# Altium integrated library Mastermind Devices.IntLib: 910 symbols (part 5 of 6)
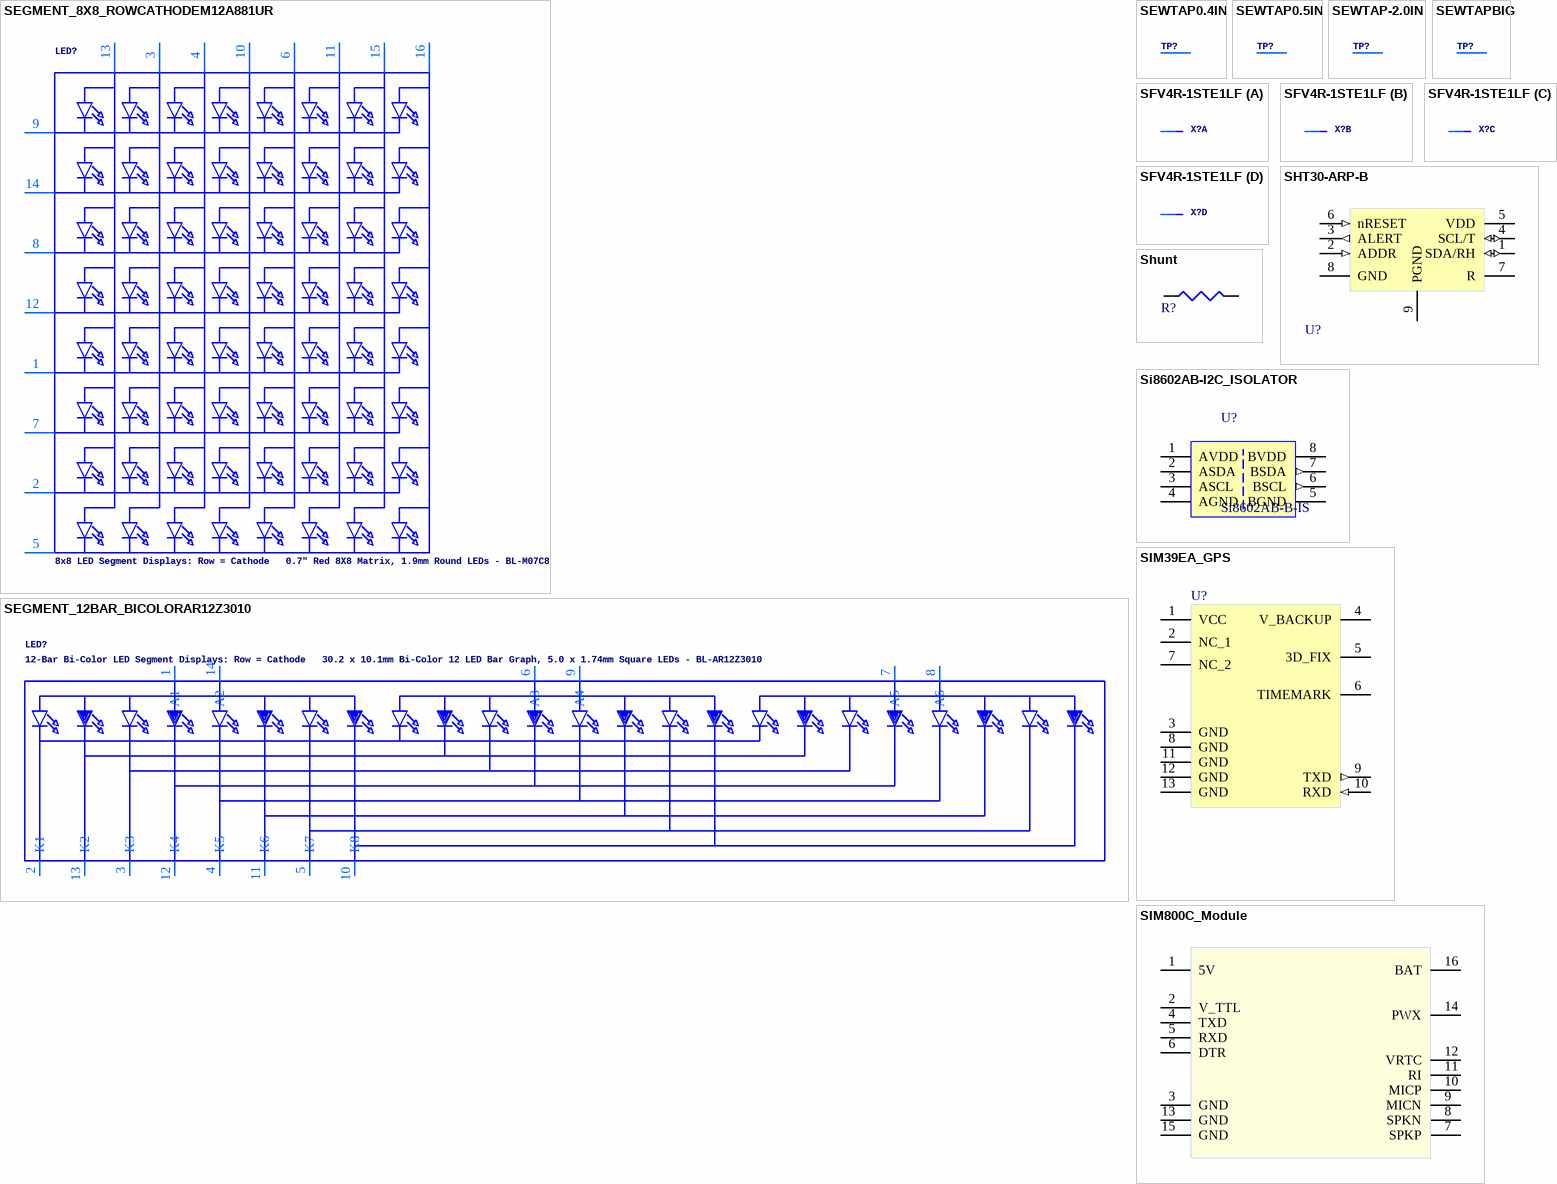
[diagram p43: symbols SEGMENT_8X8_ROWCATHODEM12A881UR to SIM800C_Module]

## SEGMENT_8X8_ROWCATHODEM12A881UR
designator LED?, comment 8x8 LED Segment Displays: Row = Cathode   0.7" Red 8X8 Matrix, 1.9mm Round LEDs - BL-M07C881UR   1.2" Red 8x8 Matrix, 3.0mm Round LEDs - BL-M12A881UR   1.2" Red 8x8 Matrix, 3.0mm Square LEDs - BL-M12A883
footprint SEGMENT_BL-M12A881UR
pins: 1 K5, 2 K7, 3 A2, 4 A3, 5 K8, 6 A5, 7 K6, 8 K3, 9 K1, 10 A4, 11 A6, 12 K4, 13 A1, 14 K2, 15 A7, 16 A8

## SEGMENT_12BAR_BICOLORAR12Z3010
designator LED?, comment 12-Bar Bi-Color LED Segment Displays: Row = Cathode   30.2 x 10.1mm Bi-Color 12 LED Bar Graph, 5.0 x 1.74mm Square LEDs - BL-AR12Z3010
footprint SEGMENT_BICOL_BL-AR12Z3010
pins: 1 A1, 2 K1, 3 K3, 4 K5, 5 K7, 6 A3, 7 A5, 8 A6, 9 A4, 10 K8, 11 K6, 12 K4, 13 K2, 14 A2

## SEWTAP0.4IN
designator TP?
footprint SEWINGTAP_0.4
pins: TAP SEW

## SEWTAP0.5IN
designator TP?
footprint SEWINGTAP_0.5
pins: TAP SEW

## SEWTAP-2.0IN
designator TP?
footprint SEWINGTAP_2.0
pins: P$1 SEW

## SEWTAPBIG
designator TP?
footprint BIGTAP
pins: P$1 SEW

## SFV4R-1STE1LF
designator X?, comment FPC Connector ZIF for SMT 0.5mm   SFV4R-1STE1LF Useful as the LED backlight connector for a PSP display  (value not drawn)
footprint SFV4R-1STE1LF
part A pins: 1 S
part B pins: 2 S
part C pins: 3 S
part D pins: 4 S

## SHT30-ARP-B
designator U?, comment HUMIDITY, TEMPERATURE  (value not drawn)
HUMIDITY, TEMPERATURE ANALOG VOLTAGE 0 ~ 100% RH ±3% RH DFN_8 TEMPERATURE & HUMIDITY SENSORS ROHS
footprint DFN-8_L2.5-W2.5-P0.50-BL-EP3 (HUMIDITY, TEMPERATURE ANALOG VOLTAGE 0 ~ 100% RH ±3% RH DFN_8 TEMPERATURE & HUMIDITY SENSORS ROHS)
pins: 1 SDA/RH (io), 2 ADDR (in), 3 ALERT (out), 4 SCL/T (io), 5 VDD, 6 nRESET (in), 7 R, 8 GND, 9 PGND

## Shunt
designator R?, comment load  (value not drawn)
Shunt Res
footprint Shunt R001
footprint R1812
footprint R2010
footprint R2012
footprint R2512
footprint R2512 - duplicate
pins: 1, 2

## Si8602AB-I2C_ISOLATOR
designator U?, comment Si8602AB-B-IS
I2C i; DETAILS: I²C Digital Isolator 2500Vrms 2 Channel 25kV/µs (Typ) CMTI 8-SOIC (0.154", 3.90mm Width); MFG: Skyworks Solutions Inc.; MFGPN: SI8401AB-B-IS; VALUE: I²C Digital Isolator 2500Vrms 2 Channel 25kV/µs; PACKAGE: 8SOIC; URL: https://www.digikey.com/en/products/detail/skyworks-solutions-inc/SI8401AB-B-IS/2278173
footprint SOIC-8E (SOIC, 8-Leads, Body 4.90x3.90mm, Pitch 1.27mm, IPC Medium Density)
footprint SOIC-8_L4.9-W3.9-P1.27-LS6.0-BL
pins: 1 AVDD (power), 2 ASDA, 3 ASCL, 4 AGND (power), 5 BGND (power), 6 BSCL (out), 7 BSDA (out), 8 BVDD (power)

## SIM39EA_GPS
designator U?
PackageDocument: ver1.0, May-2003; AEMS Code: CHANGED VALUE; DatasheetDocument: ver2.3, May-2004; PackageReference: VO20; Code_JEDEC: MO-153-AC
footprint SIM39Ea (Lora module)
pins: 1 VCC (power) "+3.3V or 2.5V JTAG Signals I/O Supply.", 2 NC_1 (power) "+3.3V Supply for internal logic.", 3 GND (power) "Ground", 4 V_BACKUP "Leave Unconnected.", 5 3D_FIX "Leave Unconnected.", 6 TIMEMARK "Leave Unconnected.", 7 NC_2 (power) "+3.3V, 2.5V, or 1.8V I/O Supply.", 8 GND (power) "Ground", 9 TXD (out) "Leave Unconnected.", 10 RXD (in) "Leave Unconnected.", 11 GND (power) "Ground", 12 GND (power) "Ground", 13 GND (power) "Ground"

## SIM800C_Module
designator X?
footprint SIM800C_Module
pins: 1 5V, 2 V_TTL, 3 GND, 4 TXD, 5 RXD, 6 DTR, 7 SPKP, 8 SPKN, 9 MICN, 10 MICP, 11 RI, 12 VRTC, 13 GND, 14 PWX, 15 GND, 16 BAT

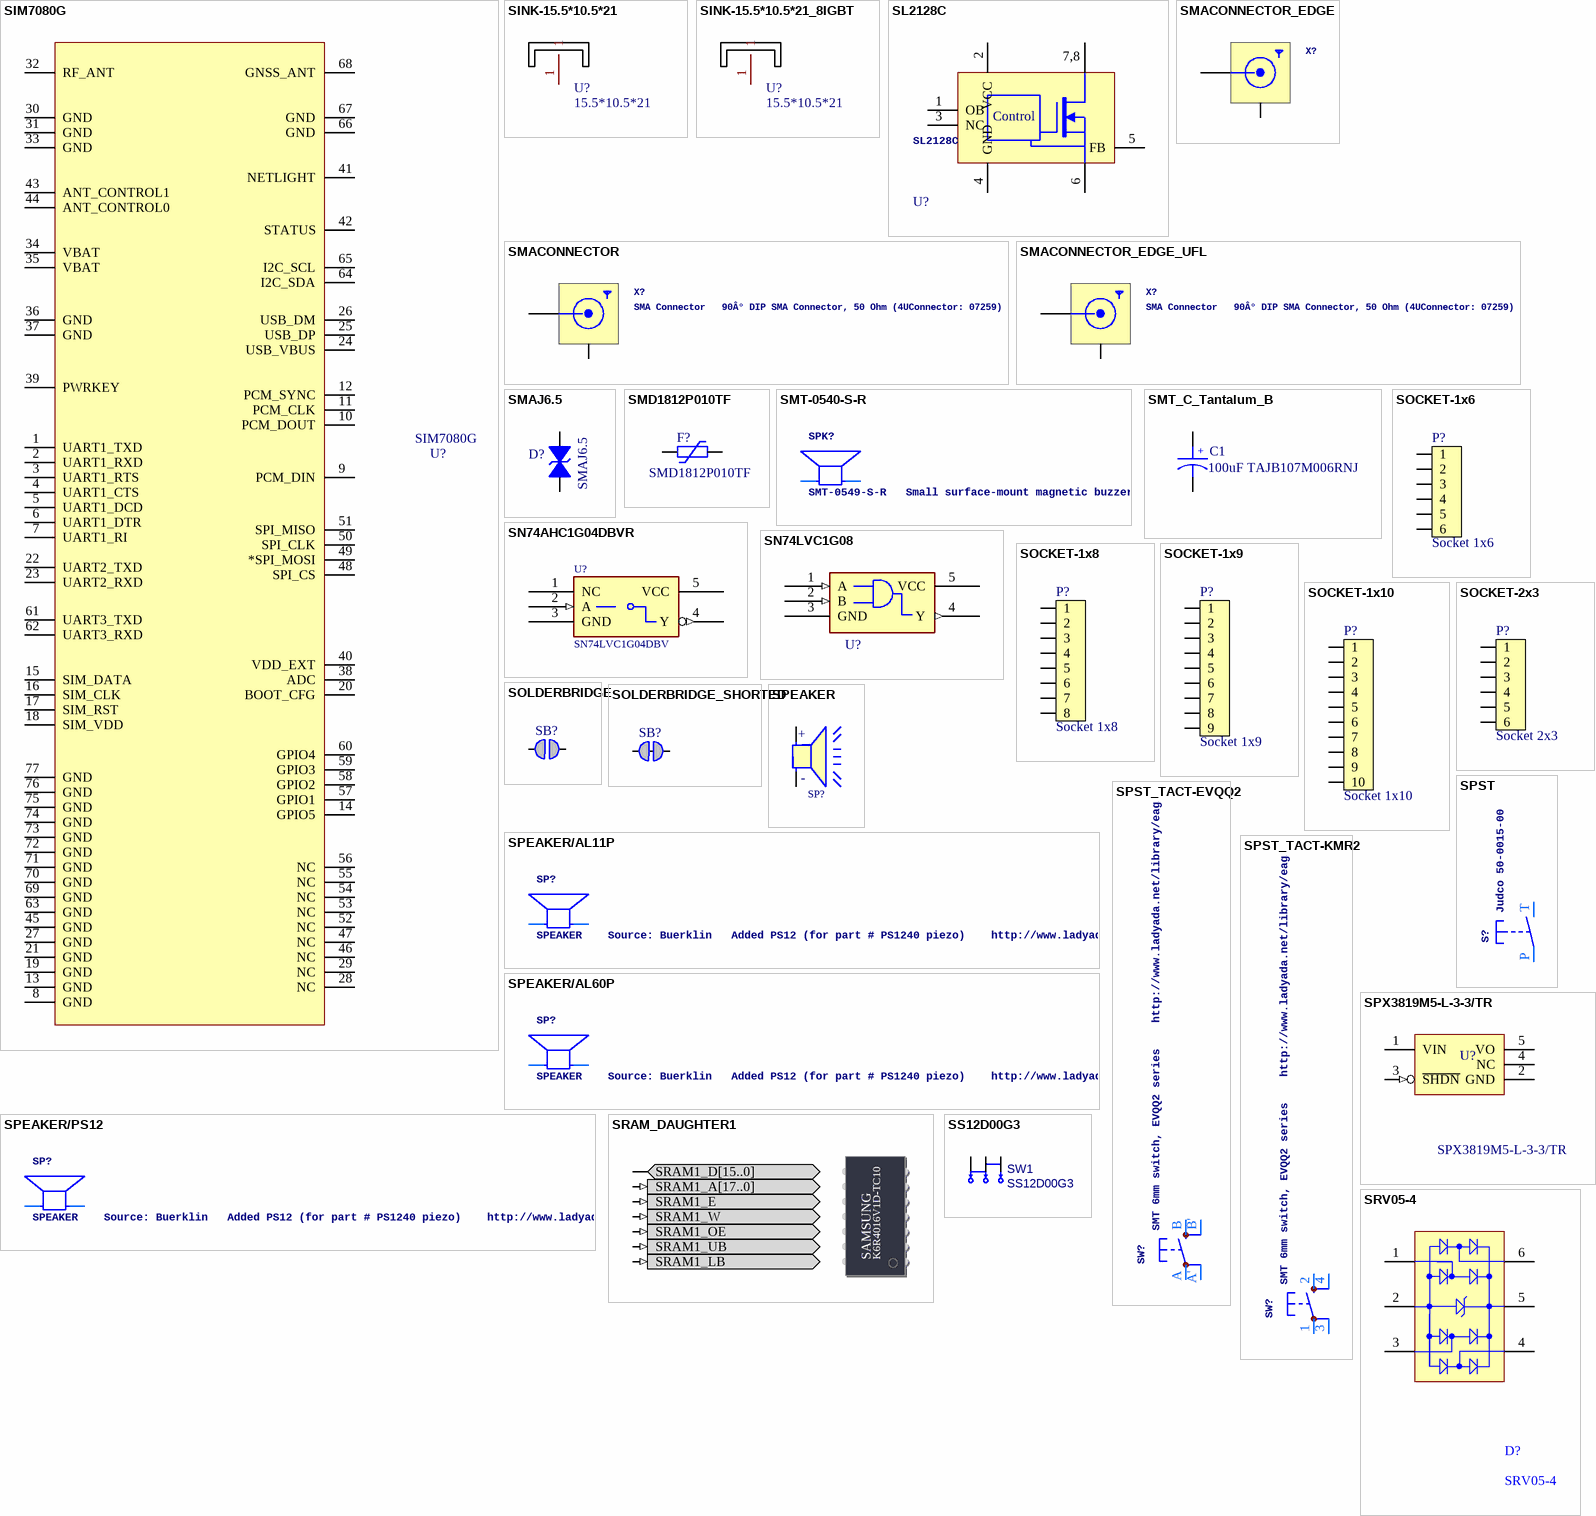
[diagram p30: symbols SIM7080G to SS12D00G3]

## SIM7080G
designator U?
SMD,17.6x15.7mm RF Transceiver Modules and Modems RoHS; Manufacturer: SIMCOM(芯讯通无线科技); Add into BOM: yes; Symbol: SIM7080G; Device: SIM7080G; LCSC Part Name: 多频段CAT-M和NB-IoT模块; Supplier Part: C2943992; Manufacturer Part: SIM7080G; Supplier Footprint: SMD,15.7x17.6mm; JLCPCB Part Class: Extended Part; Datasheet: https://item.szlcsc.com/datasheet/SIM7080G/3329189.html; Supplier: LCSC; Convert to PCB: yes
footprint LCC-SMD_SIM7080G
3D model LCC-SMD_SIM7080G
pins: 1 UART1_TXD, 2 UART1_RXD, 3 UART1_RTS, 4 UART1_CTS, 5 UART1_DCD, 6 UART1_DTR, 7 UART1_RI, 8 GND, 9 PCM_DIN, 10 PCM_DOUT, 11 PCM_CLK, 12 PCM_SYNC, 13 GND, 14 GPIO5, 15 SIM_DATA, 16 SIM_CLK, 17 SIM_RST, 18 SIM_VDD, 19 GND, 20 BOOT_CFG, 21 GND, 22 UART2_TXD, 23 UART2_RXD, 24 USB_VBUS, 25 USB_DP, 26 USB_DM, 27 GND, 28 NC, 29 NC, 30 GND, 31 GND, 32 RF_ANT, 33 GND, 34 VBAT, 35 VBAT, 36 GND, 37 GND, 38 ADC, 39 PWRKEY, 40 VDD_EXT, 41 NETLIGHT, 42 STATUS, 43 ANT_CONTROL1, 44 ANT_CONTROL0, 45 GND, 46 NC, 47 NC, 48 SPI_CS, 49 *SPI_MOSI, 50 SPI_CLK, 51 SPI_MISO, 52 NC, 53 NC, 54 NC, 55 NC, 56 NC, 57 GPIO1, 58 GPIO2, 59 GPIO3, 60 GPIO4, 61 UART3_TXD, 62 UART3_RXD, 63 GND, 64 I2C_SDA, 65 I2C_SCL, 66 GND, 67 GND, 68 GNSS_ANT, 69 GND, 70 GND, 71 GND, 72 GND, 73 GND, 74 GND, 75 GND, 76 GND, 77 GND

## SINK-15.5*10.5*21
designator U?, comment 15.5*10.5*21
Manufacturer: XSD(鑫顺达); Symbol: 15*10.5*21; Add into BOM: yes; ProductSize: 15.5*10.5*21MM; TextureOfMaterial: 6063-T5; SurfaceTreatment: 本色洗白; Shape: HType; SpringBuckle: -；-；-；-；-；-；-；-; Device: 15.5*10.5*21; LCSC Part Name: H型散热片; Supplier Part: C4649; Manufacturer Part: 15.5*10.5*21; Supplier Footprint: -; JLCPCB Part Class: Extended Part; Datasheet: https://atta.szlcsc.com/upload/public/pdf/source/20171202/C4649_15122106328221160233.pdf; Supplier: LCSC; Convert to PCB: yes; brand: XSD(鑫顺达); Model: 15.5*10.5*21; Colour: White; NumberOfHoles: -; NumberOfTeeth: -; NumberOfNails: -
footprint SINK-TH_L15.0-W10.5-H21.0
pins: 1

## SINK-15.5*10.5*21_8IGBT
designator U?, comment 15.5*10.5*21
Manufacturer: XSD(鑫顺达); Symbol: 15*10.5*21; Add into BOM: yes; ProductSize: 15.5*10.5*21MM; TextureOfMaterial: 6063-T5; SurfaceTreatment: 本色洗白; Shape: HType; SpringBuckle: -；-；-；-；-；-；-；-; Device: 15.5*10.5*21; LCSC Part Name: H型散热片; Supplier Part: C4649; Manufacturer Part: 15.5*10.5*21; Supplier Footprint: -; JLCPCB Part Class: Extended Part; Datasheet: https://atta.szlcsc.com/upload/public/pdf/source/20171202/C4649_15122106328221160233.pdf; Supplier: LCSC; Convert to PCB: yes; brand: XSD(鑫顺达); Model: 15.5*10.5*21; Colour: White; NumberOfHoles: -; NumberOfTeeth: -; NumberOfNails: -
footprint SINK-TH_L15.0-W10.5-H21.0 - 8IGBT
pins: 1

## SL2128C
designator U?
SMPS DRIVER
footprint DIL08-ROUND
pins: 1 OB (power), 2 VCC, 3 NC, 4 GND, 5 FB (power), 6 GND, 7 OC, 8 OC
text: 7,8; Control

## SMACONNECTOR
designator X?, comment SMA Connector   90Â° DIP SMA Connector, 50 Ohm (4UConnector: 07259)
footprint SMA90_DIP
pins: F ANT, GND (power)

## SMACONNECTOR_EDGE
designator X?, comment SMA Connector   90Â° DIP SMA Connector, 50 Ohm (4UConnector: 07259)  (value not drawn)
footprint SMA_EDGELAUNCH
pins: F ANT, GND (power)

## SMACONNECTOR_EDGE_UFL
designator X?, comment SMA Connector   90Â° DIP SMA Connector, 50 Ohm (4UConnector: 07259)
footprint SMA_EDGELAUNCH_UFL
pins: F ANT, GND GND3 (power)

## SMAJ6.5
designator D?
6.5V DO-214AC(SMA) ESD and Surge Protection (TVS/ESD) ROHS; Manufacturer: Brightking(台湾君耀); Manufacturer Part: SMAJ6.5CA/TR7; Contributor: lcsc; Supplier: LCSC; Supplier Part: C3036084; spicePre: D; spiceSymbolName: SMAJ6.5CA/TR7
footprint SMA_L4.3-W2.6-LS5.1-BI
pins: 1, 2

## SMD1812P010TF
designator F?
30V 100mA 100A 300mA 1812 Resettable Fuses ROHS; Contributor: Warren375; spicePre: F
footprint PTC1812L
pins: 1, 2

## SMT-0540-S-R
designator SPK?, comment SMT-0549-S-R   Small surface-mount magnetic buzzer
footprint SMT-0540-S-R
pins: + -, - +

## SMT_C_Tantalum_B
designator C1, comment 100uF TAJB107M006RNJ
Capacitor, SM Tantalum; Body 3.5 x 2.8 mm (LxW typ)
footprint SMT_C_Tantalum_B (Capacitor, SM Tantalum; Body 3.5 x 2.8 mm (LxW typ))
pins: 1, 2
text: +

## SN74AHC1G04DBVR
designator U?, comment SN74LVC1G04DBV
Manufacturer: TI
footprint SO-G5/P.95
pins: 1 NC, 2 A (in), 3 GND (power), 4 Y (out), 5 VCC (power)

## SN74LVC1G08
designator U?  (value not drawn)
AND GATE  IC SOT23-5
footprint SOT23-5L
pins: 1 A (in), 2 B (in), 3 GND (power), 4 Y (out), 5 VCC (power)

## SOCKET-1x6
designator P?, comment Socket 1x6
Socket 1x6, 2.54mm (100mil), SMD; Part Number: Socket 1x6 SMD; Manufacturer: WCON; Manufacturer Part Number: 2171-106MS0CUNR1; 2nd source part number: SSM-106-F-SV-P-TR; Artikkelnr Noca: 55030001; Artikkelnr Simpro: N.A.; Datasheet: *; Footprint Doc: SOCKET_1x6_SMD; LatestRevisionDate: 2016-01-22; Pin Count: 6; Publisher: Nordic Semiconductor; Published: 2016-01-22; Value: Socket 1x6; Note: *; Supplier: Cabcon; Supplier part number: 2171-106MS0CUNR1; 2nd source Supplier: Samtec
footprint SOCKET_1x6_SMD
pins: 1, 2, 3, 4, 5, 6

## SOCKET-1x8
designator P?, comment Socket 1x8
Socket 1x8, 2.54mm (100mil), SMD; Part Number: Socket 1x8 SMD; Manufacturer: WCON; Manufacturer Part Number: 2171-108MS0CUNR1; 2nd source part number: SSM-108-F-SV-P-TR; Artikkelnr Noca: 55030002; Artikkelnr Simpro: N.A.; Datasheet: *; Footprint Doc: SOCKET_1x8_SMD; LatestRevisionDate: 2016-01-22; Pin Count: 8; Publisher: Nordic Semiconductor; Published: 2016-01-22; Value: Socket 1x8; Note: *; Supplier: Cabcon; Supplier part number: 2171-108MS0CUNR1; 2nd source Supplier: Samtec
footprint SOCKET_1x8_SMD
pins: 1, 2, 3, 4, 5, 6, 7, 8

## SOCKET-1x9
designator P?, comment Socket 1x9
Socket 1x9, 2.54mm (100mil), SMD; Part Number: Socket 1x9 SMD; Manufacturer: WCON; Manufacturer Part Number: 2171-109MS0CUNR1; 2nd source part number: SSM-109-L-SV; Artikkelnr Noca: 55030003; Artikkelnr Simpro: N.A.; Datasheet: *; Footprint Doc: SOCKET_1x9_SMD; LatestRevisionDate: 2016-01-22; Pin Count: 9; Publisher: Nordic Semiconductor; Published: 2016-01-22; Value: Socket 1x9; Note: *; Supplier: Cabcon; Supplier part number: 2171-109MS0CUNR1; 2nd source Supplier: Samtec
footprint SOCKET_1x9_SMD
pins: 1, 2, 3 (power), 4 (power), 5 (power), 6 (power), 7 (power), 8 (power), 9 (power)

## SOCKET-1x10
designator P?, comment Socket 1x10
Socket 1x10, 2.54mm (100mil), SMD; Part Number: Socket 1x10 SMD; Manufacturer: WCON; Manufacturer Part Number: 2171-110MS0CUNR1; 2nd source part number: SSM-110-F-SV-P-TR; Artikkelnr Noca: 55030004; Artikkelnr Simpro: N.A.; Datasheet: *; Footprint Doc: SOCKET_1x10_SMD; LatestRevisionDate: 2016-01-22; Pin Count: 10; Publisher: Nordic Semiconductor; Published: 2016-01-22; Value: Socket 1x10; Note: *; Supplier: Cabcon; Supplier part number: 2171-110MS0CUNR1; 2nd source Supplier: Samtec
footprint SOCKET_1x10_SMD
pins: 1, 2, 3, 4, 5, 6, 7, 8, 9, 10

## SOCKET-2x3
designator P?, comment Socket 2x3
Socket 2x3, 2.54mm (100mil), SMD; Part Number: Socket 2x3 SMD Bottom; Manufacturer: Samtec; Manufacturer Part Number: SSM-103-F-DV-P-TR; 2nd source part number: S5712-ND; Note: Not mounted; Artikkelnr Noca: 55019255; Artikkelnr Simpro: N.A.; Datasheet: http://www.samtec.com/documents/webfiles/pdf/SSM_SM.PDF; LatestRevisionDate: 2014-06-10; Pin Count: 6; Publisher: Nordic Semiconductor; Published: 2014-06-10; Value: Socket 2x3; Supplier: Samtec; Supplier part number: SSM-103-F-DV-P-TR; 2nd source Supplier: Digi-Key; Footprint Doc: SOCKET_2x3_SMD-2.54mm-bottom
footprint SOCKET_2x3_SMD-2.54mm-bottom
pins: 1, 2, 3 (power), 4 (power), 5 (power), 6 (power)

## SOLDERBRIDGE
designator SB?, comment Solderbridge  (value not drawn)  (no BOM)
Artikkelnr Noca: N.A.; Part Number: Solderbridge; Manufacturer: *; Manufacturer Part Number: *; Datasheet: *; LatestRevisionDate: 2009-12-14; Pin Count: 2; Publisher: Nordic Semiconductor; Published: 2009-12-14; Value: Solderbridge; Note: *; Supplier: *; Supplier part number: *; 2nd source Supplier: *; 2nd source part number: *; Footprint Doc: Solderbridge; Artikkelnr Simpro: N.A.
footprint Solderbridge
pins: 1 0, 2 1

## SOLDERBRIDGE_SHORTED
designator SB?, comment Solderbridge  (value not drawn)  (net tie, no BOM)
Shorted Solderbridge; Part Number: Solderbridge Shorted; Artikkelnr Noca: N.A.; Manufacturer: *; Manufacturer Part Number: *; Datasheet: *; LatestRevisionDate: 2012-08-07; Pin Count: 2; Publisher: Nordic Semiconductor; Published: 2012-08-07; Value: Solderbridge; Note: *; Supplier: *; Supplier part number: *; 2nd source Supplier: *; 2nd source part number: *; Footprint Doc: Solderbridge_Shorted; Artikkelnr Simpro: N.A.
footprint Solderbridge_Shorted
pins: 1 0, 2 1

## SPEAKER
designator SP?, comment BUZZER    Source: Buerklin  (value not drawn)
OC_FARNELL: unknown; OC_NEWARK: unknown
footprint HDR1X2
pins: 1 -, 2 +

## SPEAKER/AL11P
designator SP?, comment SPEAKER    Source: Buerklin   Added PS12 (for part # PS1240 piezo)    http://www.ladyada.net/library/pcb/eaglelibrary.html
footprint AL11P
pins: +, -

## SPEAKER/AL60P
designator SP?, comment SPEAKER    Source: Buerklin   Added PS12 (for part # PS1240 piezo)    http://www.ladyada.net/library/pcb/eaglelibrary.html
footprint AL60P
pins: 1 +, 2 -

## SPEAKER/PS12
designator SP?, comment SPEAKER    Source: Buerklin   Added PS12 (for part # PS1240 piezo)    http://www.ladyada.net/library/pcb/eaglelibrary.html
footprint PS12
pins: P$1 +, P$2 -

## SPST
designator S?, comment Judco 50-0015-00
footprint JUDCOSPST
pins: P, T S

## SPST_TACT-EVQQ2
designator SW?, comment SMT 6mm switch, EVQQ2 series    http://www.ladyada.net/library/eagle
footprint EVQ-Q2
pins: A P, A' P1, B S, B' S1

## SPST_TACT-KMR2
designator SW?, comment SMT 6mm switch, EVQQ2 series    http://www.ladyada.net/library/eagle
footprint KMR2
pins: 1 P, 2 S, 3 P1, 4 S1

## SPX3819M5-L-3-3/TR
designator U?
70dB Positive SOT-23-5 Voltage Regulators - Linear, Low Drop Out (LDO) Regulators ROHS; Manufacturer: MaxLinear(迈凌); Add into BOM: yes; Output Type: Fixed; Voltage - Supply: 16V; Output Voltage: 3.3V; Output Current: 500mA; Voltage Dropout: 340mV@(500mA); standby current: 90uA; Noise: 40uVrms; Number of Outputs: 1; Symbol: SPX3819M5-L-3-3/TR; Device: SPX3819M5-L-3-3/TR; LCSC Part Name: 输入16V 输出3.3V 500mA; Supplier Part: C9055; Manufacturer Part: SPX3819M5-L-3-3/TR; Supplier Footprint: SOT-23-5; JLCPCB Part Class: Extended Part; Datasheet: https://item.szlcsc.com/datasheet/SPX3819M5-L-3-3%252FTR/9575.html; Supplier: LCSC; Convert to PCB: yes; Power Supply Rejection Ratio (PSRR): 70dB; Features: Enable；Over Temperature Protection；Over Current Protection; Operating Temperature: -40℃~+125℃; Output Configuration: Positive
footprint SOT23-5L
pins: 1 VIN, 2 GND (power), 3 ~{SHDN} (in), 4 NC, 5 VO

## SRAM_DAUGHTER1
designator ?  (value not drawn)
Free Static RAM - Daughterboard; PortComponent: True; Published: 14-May-2007; Publisher: Altium Limited; HelpURL: TR0149 Technical Reference for Altium's Xilinx Spartan-3 Daughter Board DB30.pdf#page=16
pins: SRAM1_A[17..0] (in), SRAM1_D[15..0] (io), SRAM1_E (in), SRAM1_LB (in), SRAM1_OE (in), SRAM1_UB (in), SRAM1_W (in)
text: SAMSUNG; K6R4016V1D-TC10

## SRV05-4
designator D?
Manufacturer: MSKSEMI(美森科); Symbol: SRV05-4_C2836319; Add into BOM: yes; Reverse Stand-Off Voltage (Vrwm): 5V; Maximum Clamping Voltage: 15V; Peak Pulse Power Dissipation (Ppp)@10/1000us: 60W; Breakdown Voltage: 9V; Type: ESD; Device: SRV05-4_C2836319; Supplier: LCSC; Supplier Part: C2836319; Manufacturer Part: SRV05-4; JLCPCB Part Class: Extended Part; LCSC Part Name: SRV05-4; Supplier Footprint: SOT-23-6; Datasheet: https://atta.szlcsc.com/upload/public/pdf/source/20220222/F01BB54FA817A9A0327E7B3253CC806E.pdf; Convert to PCB: yes
footprint SOT23-6
pins: 1 I/O 1, 2 GND, 3 I/O 2, 4 I/O 3, 5 VBUS, 6 I/O 4

## SS12D00G3
designator SW1
BOM_Manufacturer: null; Contributor: lcsc; BOM_Supplier: LCSC; BOM_Supplier Part: C9900018735; BOM_Manufacturer Part: SS12D00G3; BOM_JLCPCB Part Class: Extended Part; spicePre: S; spiceSymbolName: SS12D00G3
footprint SS12D00G3
pins: 1, 2, 3
